# Altium footprint library Connector_Samtec_HLE_SMD.PcbLib: 290 footprints (part 17 of 24)
Each footprint in its own frame and in the unit in brackets; x right, y up, seen from the top. Pads: shape width x height; smd on the part's side, far side on the other; paste and mask are expansions set on the pad; w line width, h text height; cw(c..) or ccw(c..) is an arc to the next point about the centre after c.
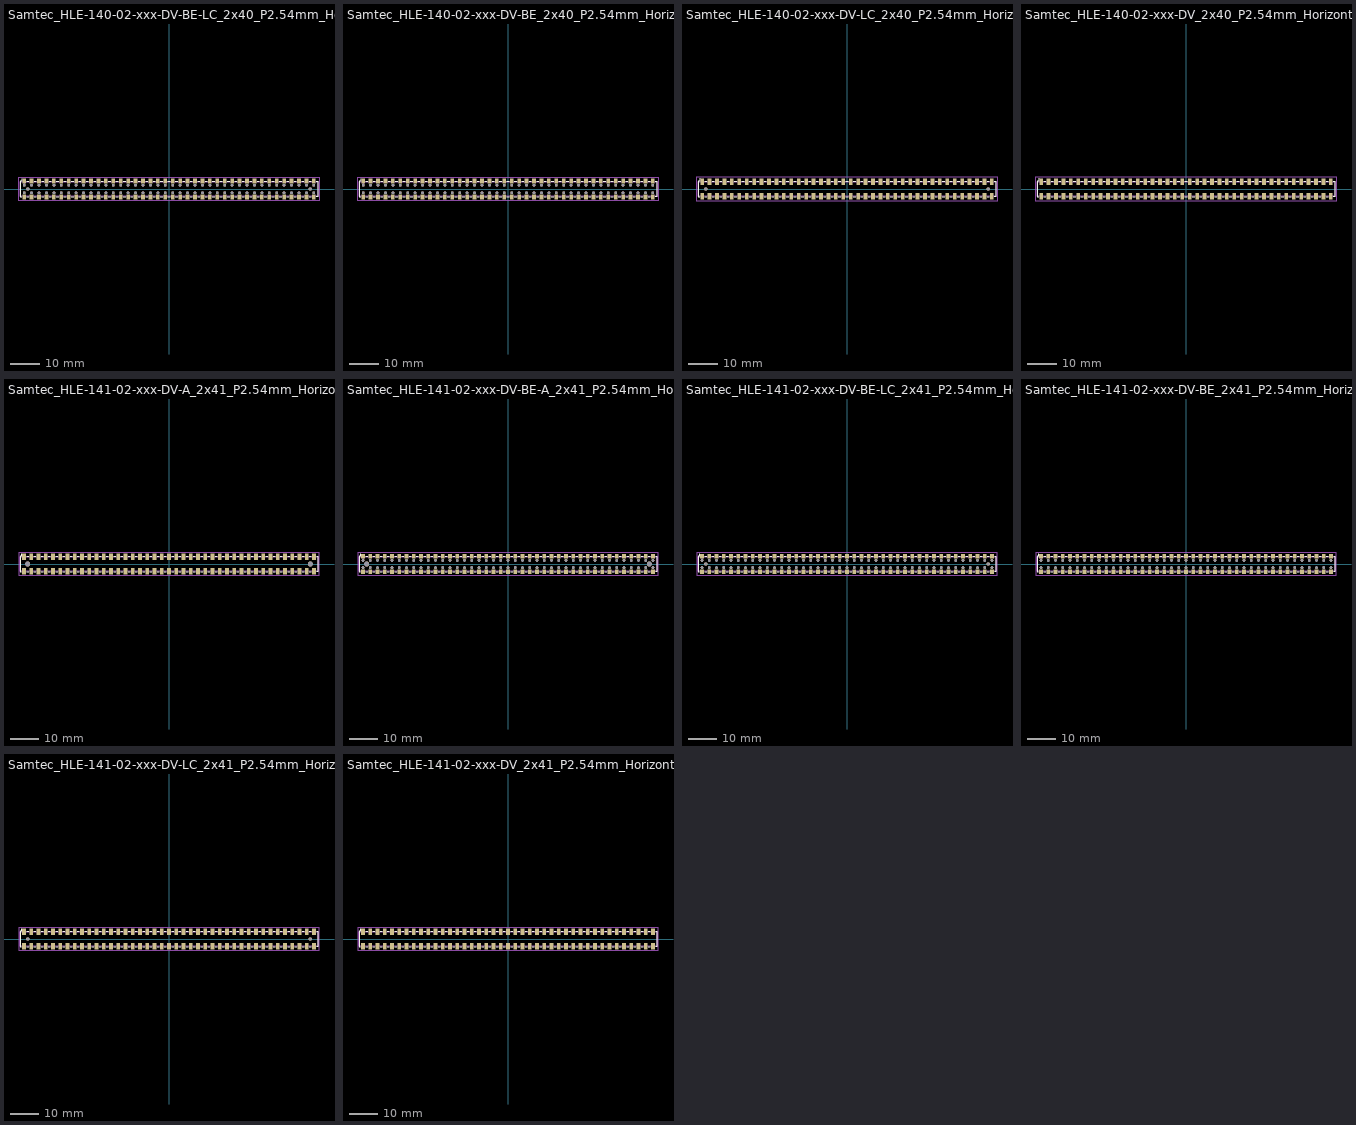
[diagram p16: the footprints below, top view; thin cyan lines are the x and y axes]

## Samtec_HLE-140-02-xxx-DV-BE-LC_2x40_P2.54mm_Horizontal [mm]
pads (162):
  rect 1.27x1.68 smd: 1(-49.53,2.72) 2(-49.53,-2.72) 3(-46.99,2.72) 4(-46.99,-2.72) 5(-44.45,2.72) 6(-44.45,-2.72) 7(-41.91,2.72) 8(-41.91,-2.72) 9(-39.37,2.72) 10(-39.37,-2.72) 11(-36.83,2.72) 12(-36.83,-2.72) 13(-34.29,2.72) 14(-34.29,-2.72) 15(-31.75,2.72) 16(-31.75,-2.72) 17(-29.21,2.72) 18(-29.21,-2.72) 19(-26.67,2.72) 20(-26.67,-2.72) 21(-24.13,2.72) 22(-24.13,-2.72) 23(-21.59,2.72) 24(-21.59,-2.72) 25(-19.05,2.72) 26(-19.05,-2.72) 27(-16.51,2.72) 28(-16.51,-2.72) 29(-13.97,2.72) 30(-13.97,-2.72) 31(-11.43,2.72) 32(-11.43,-2.72) 33(-8.89,2.72) 34(-8.89,-2.72) 35(-6.35,2.72) 36(-6.35,-2.72) 37(-3.81,2.72) 38(-3.81,-2.72) 39(-1.27,2.72) 40(-1.27,-2.72) 41(1.27,2.72) 42(1.27,-2.72) 43(3.81,2.72) 44(3.81,-2.72) 45(6.35,2.72) 46(6.35,-2.72) 47(8.89,2.72) 48(8.89,-2.72) 49(11.43,2.72) 50(11.43,-2.72) 51(13.97,2.72) 52(13.97,-2.72) 53(16.51,2.72) 54(16.51,-2.72) 55(19.05,2.72) 56(19.05,-2.72) 57(21.59,2.72) 58(21.59,-2.72) 59(24.13,2.72) 60(24.13,-2.72) 61(26.67,2.72) 62(26.67,-2.72) 63(29.21,2.72) 64(29.21,-2.72) 65(31.75,2.72) 66(31.75,-2.72) 67(34.29,2.72) 68(34.29,-2.72) 69(36.83,2.72) 70(36.83,-2.72) 71(39.37,2.72) 72(39.37,-2.72) 73(41.91,2.72) 74(41.91,-2.72) 75(44.45,2.72) 76(44.45,-2.72) 77(46.99,2.72) 78(46.99,-2.72) 79(49.53,2.72) 80(49.53,-2.72)
  round 0.97 hole 0.97: Un1(41.91,-1.27) Un2(49.53,1.27) Un3(41.91,1.27) Un4(3.81,-1.27) Un5(-21.59,1.27) Un6(39.37,-1.27) Un7(-36.83,1.27) Un8(36.83,1.27) Un9(-41.91,1.27) Un10(-6.35,1.27) Un11(-34.29,-1.27) Un12(46.99,1.27) Un13(49.53,-1.27) Un14(-8.89,1.27) Un15(36.83,-1.27) Un16(-11.43,1.27) Un17(-29.21,1.27) Un18(13.97,1.27) Un19(-44.45,1.27) Un20(6.35,1.27) Un21(21.59,-1.27) Un22(-6.35,-1.27) Un23(24.13,1.27) Un24(46.99,-1.27) Un25(-39.37,1.27) Un26(-41.91,-1.27) Un27(44.45,1.27) Un28(-11.43,-1.27) Un30(39.37,1.27) Un31(-3.81,1.27) Un32(3.81,1.27) Un33(16.51,1.27) Un34(-13.97,-1.27) Un35(-24.13,1.27) Un36(-16.51,1.27) Un37(-44.45,-1.27) Un38(-36.83,-1.27) Un39(-39.37,-1.27) Un40(-3.81,-1.27) Un41(-49.53,1.27) Un42(31.75,-1.27) Un43(-8.89,-1.27) Un44(-21.59,-1.27) Un45(26.67,1.27) Un46(29.21,-1.27) Un48(-46.99,1.27) Un49(-24.13,-1.27) Un50(34.29,-1.27) Un51(-26.67,-1.27) Un52(-46.99,-1.27) Un53(-1.27,1.27) Un54(6.35,-1.27) Un55(-49.53,-1.27) Un56(8.89,-1.27) Un57(26.67,-1.27) Un58(11.43,1.27) Un59(19.05,-1.27) Un60(24.13,-1.27) Un61(13.97,-1.27) Un62(31.75,1.27) Un63(-34.29,1.27) Un64(-16.51,-1.27) Un65(-13.97,1.27) Un66(11.43,-1.27) Un67(-31.75,-1.27) Un68(16.51,-1.27) Un69(21.59,1.27) Un70(-1.27,-1.27) Un71(34.29,1.27) Un72(1.27,1.27) Un73(-31.75,1.27) Un74(44.45,-1.27) Un75(1.27,-1.27) Un76(8.89,1.27) Un77(-29.21,-1.27) Un78(-19.05,-1.27) Un79(29.21,1.27) Un80(-26.67,1.27) Un81(-19.05,1.27) Un82(19.05,1.27)
  round 1.19 hole 1.19: Un29(48.26,0) Un47(-48.26,0)
F.SilkS:
  lines w0.12: -50.425,-2.65 -50.91,-2.65 -50.91,2.65 -50.425,2.65 -50.425,3.56 ; -48.635,-2.65 -47.885,-2.65 ; -48.635,2.65 -47.885,2.65 ; -46.095,-2.65 -45.345,-2.65 ; -46.095,2.65 -45.345,2.65 ; -43.555,-2.65 -42.805,-2.65 ; -43.555,2.65 -42.805,2.65 ; -41.015,-2.65 -40.265,-2.65 ; -41.015,2.65 -40.265,2.65 ; -38.475,-2.65 -37.725,-2.65 ; -38.475,2.65 -37.725,2.65 ; -35.935,-2.65 -35.185,-2.65 ; -35.935,2.65 -35.185,2.65 ; -33.395,-2.65 -32.645,-2.65 ; -33.395,2.65 -32.645,2.65 ; -30.855,-2.65 -30.105,-2.65 ; -30.855,2.65 -30.105,2.65 ; -28.315,-2.65 -27.565,-2.65 ; -28.315,2.65 -27.565,2.65 ; -25.775,-2.65 -25.025,-2.65 ; -25.775,2.65 -25.025,2.65 ; -23.235,-2.65 -22.485,-2.65 ; -23.235,2.65 -22.485,2.65 ; -20.695,-2.65 -19.945,-2.65 ; -20.695,2.65 -19.945,2.65 ; -18.155,-2.65 -17.405,-2.65 ; -18.155,2.65 -17.405,2.65 ; -15.615,-2.65 -14.865,-2.65 ; -15.615,2.65 -14.865,2.65 ; -13.075,-2.65 -12.325,-2.65 ; -13.075,2.65 -12.325,2.65 ; -10.535,-2.65 -9.785,-2.65 ; -10.535,2.65 -9.785,2.65 ; -7.995,-2.65 -7.245,-2.65 ; -7.995,2.65 -7.245,2.65 ; -5.455,-2.65 -4.705,-2.65 ; -5.455,2.65 -4.705,2.65 ; -2.915,-2.65 -2.165,-2.65 ; -2.915,2.65 -2.165,2.65 ; -0.375,-2.65 0.375,-2.65 ; -0.375,2.65 0.375,2.65 ; 2.165,-2.65 2.915,-2.65 ; 2.165,2.65 2.915,2.65 ; 4.705,-2.65 5.455,-2.65 ; 4.705,2.65 5.455,2.65 ; 7.245,-2.65 7.995,-2.65 ; 7.245,2.65 7.995,2.65 ; 9.785,-2.65 10.535,-2.65 ; 9.785,2.65 10.535,2.65 ; 12.325,-2.65 13.075,-2.65 ; 12.325,2.65 13.075,2.65 ; 14.865,-2.65 15.615,-2.65 ; 14.865,2.65 15.615,2.65 ; 17.405,-2.65 18.155,-2.65 ; 17.405,2.65 18.155,2.65 ; 19.945,-2.65 20.695,-2.65 ; 19.945,2.65 20.695,2.65 ; 22.485,-2.65 23.235,-2.65 ; 22.485,2.65 23.235,2.65 ; 25.025,-2.65 25.775,-2.65 ; 25.025,2.65 25.775,2.65 ; 27.565,-2.65 28.315,-2.65 ; 27.565,2.65 28.315,2.65 ; 30.105,-2.65 30.855,-2.65 ; 30.105,2.65 30.855,2.65 ; 32.645,-2.65 33.395,-2.65 ; 32.645,2.65 33.395,2.65 ; 35.185,-2.65 35.935,-2.65 ; 35.185,2.65 35.935,2.65 ; 37.725,-2.65 38.475,-2.65 ; 37.725,2.65 38.475,2.65 ; 40.265,-2.65 41.015,-2.65 ; 40.265,2.65 41.015,2.65 ; 42.805,-2.65 43.555,-2.65 ; 42.805,2.65 43.555,2.65 ; 45.345,-2.65 46.095,-2.65 ; 45.345,2.65 46.095,2.65 ; 47.885,-2.65 48.635,-2.65 ; 47.885,2.65 48.635,2.65 ; 50.425,-2.65 50.91,-2.65 50.91,2.65 50.425,2.65
F.CrtYd:
  lines w0.05: -51.3,-4.06 -51.3,4.06 51.3,4.06 51.3,-4.06 -51.3,-4.06
F.Fab:
  lines w0.1: -50.03,2.54 -49.53,1.833 -49.03,2.54 ; -50.8,-2.54 50.8,-2.54 50.8,2.54 -50.8,2.54 -50.8,-2.54
  text "'.Designator'" at -4.047,-2.68 h1

## Samtec_HLE-140-02-xxx-DV-BE_2x40_P2.54mm_Horizontal [mm]
pads (160):
  rect 1.27x1.68 smd: 1(-49.53,2.72) 2(-49.53,-2.72) 3(-46.99,2.72) 4(-46.99,-2.72) 5(-44.45,2.72) 6(-44.45,-2.72) 7(-41.91,2.72) 8(-41.91,-2.72) 9(-39.37,2.72) 10(-39.37,-2.72) 11(-36.83,2.72) 12(-36.83,-2.72) 13(-34.29,2.72) 14(-34.29,-2.72) 15(-31.75,2.72) 16(-31.75,-2.72) 17(-29.21,2.72) 18(-29.21,-2.72) 19(-26.67,2.72) 20(-26.67,-2.72) 21(-24.13,2.72) 22(-24.13,-2.72) 23(-21.59,2.72) 24(-21.59,-2.72) 25(-19.05,2.72) 26(-19.05,-2.72) 27(-16.51,2.72) 28(-16.51,-2.72) 29(-13.97,2.72) 30(-13.97,-2.72) 31(-11.43,2.72) 32(-11.43,-2.72) 33(-8.89,2.72) 34(-8.89,-2.72) 35(-6.35,2.72) 36(-6.35,-2.72) 37(-3.81,2.72) 38(-3.81,-2.72) 39(-1.27,2.72) 40(-1.27,-2.72) 41(1.27,2.72) 42(1.27,-2.72) 43(3.81,2.72) 44(3.81,-2.72) 45(6.35,2.72) 46(6.35,-2.72) 47(8.89,2.72) 48(8.89,-2.72) 49(11.43,2.72) 50(11.43,-2.72) 51(13.97,2.72) 52(13.97,-2.72) 53(16.51,2.72) 54(16.51,-2.72) 55(19.05,2.72) 56(19.05,-2.72) 57(21.59,2.72) 58(21.59,-2.72) 59(24.13,2.72) 60(24.13,-2.72) 61(26.67,2.72) 62(26.67,-2.72) 63(29.21,2.72) 64(29.21,-2.72) 65(31.75,2.72) 66(31.75,-2.72) 67(34.29,2.72) 68(34.29,-2.72) 69(36.83,2.72) 70(36.83,-2.72) 71(39.37,2.72) 72(39.37,-2.72) 73(41.91,2.72) 74(41.91,-2.72) 75(44.45,2.72) 76(44.45,-2.72) 77(46.99,2.72) 78(46.99,-2.72) 79(49.53,2.72) 80(49.53,-2.72)
  round 0.97 hole 0.97: Un1(-26.67,1.27) Un2(-34.29,1.27) Un3(13.97,1.27) Un4(-16.51,1.27) Un5(-6.35,1.27) Un6(-11.43,1.27) Un7(1.27,1.27) Un8(-46.99,1.27) Un9(21.59,-1.27) Un10(39.37,-1.27) Un11(-13.97,1.27) Un12(-29.21,-1.27) Un13(34.29,-1.27) Un14(19.05,1.27) Un15(-11.43,-1.27) Un16(36.83,1.27) Un17(-44.45,1.27) Un18(46.99,-1.27) Un19(21.59,1.27) Un20(26.67,1.27) Un21(19.05,-1.27) Un22(-19.05,1.27) Un23(-36.83,-1.27) Un24(16.51,1.27) Un25(-3.81,1.27) Un26(-49.53,1.27) Un27(-1.27,1.27) Un28(16.51,-1.27) Un29(-31.75,1.27) Un30(49.53,-1.27) Un31(6.35,1.27) Un32(31.75,1.27) Un33(49.53,1.27) Un34(41.91,-1.27) Un35(-3.81,-1.27) Un36(34.29,1.27) Un37(-41.91,-1.27) Un38(13.97,-1.27) Un39(-13.97,-1.27) Un40(41.91,1.27) Un41(11.43,-1.27) Un42(6.35,-1.27) Un43(1.27,-1.27) Un44(44.45,1.27) Un45(-19.05,-1.27) Un46(3.81,1.27) Un47(-8.89,1.27) Un48(-1.27,-1.27) Un49(11.43,1.27) Un50(-44.45,-1.27) Un51(-39.37,1.27) Un52(-41.91,1.27) Un53(31.75,-1.27) Un54(3.81,-1.27) Un55(-24.13,-1.27) Un56(-49.53,-1.27) Un57(24.13,-1.27) Un58(39.37,1.27) Un59(-16.51,-1.27) Un60(24.13,1.27) Un61(29.21,-1.27) Un62(-36.83,1.27) Un63(-31.75,-1.27) Un64(-26.67,-1.27) Un65(-6.35,-1.27) Un66(44.45,-1.27) Un67(36.83,-1.27) Un68(-21.59,1.27) Un69(-29.21,1.27) Un70(46.99,1.27) Un71(-46.99,-1.27) Un72(-21.59,-1.27) Un73(8.89,1.27) Un74(-34.29,-1.27) Un75(29.21,1.27) Un76(-24.13,1.27) Un77(26.67,-1.27) Un78(-39.37,-1.27) Un79(8.89,-1.27) Un80(-8.89,-1.27)
F.SilkS:
  lines w0.12: -50.425,-2.65 -50.91,-2.65 -50.91,2.65 -50.425,2.65 -50.425,3.56 ; -48.635,-2.65 -47.885,-2.65 ; -48.635,2.65 -47.885,2.65 ; -46.095,-2.65 -45.345,-2.65 ; -46.095,2.65 -45.345,2.65 ; -43.555,-2.65 -42.805,-2.65 ; -43.555,2.65 -42.805,2.65 ; -41.015,-2.65 -40.265,-2.65 ; -41.015,2.65 -40.265,2.65 ; -38.475,-2.65 -37.725,-2.65 ; -38.475,2.65 -37.725,2.65 ; -35.935,-2.65 -35.185,-2.65 ; -35.935,2.65 -35.185,2.65 ; -33.395,-2.65 -32.645,-2.65 ; -33.395,2.65 -32.645,2.65 ; -30.855,-2.65 -30.105,-2.65 ; -30.855,2.65 -30.105,2.65 ; -28.315,-2.65 -27.565,-2.65 ; -28.315,2.65 -27.565,2.65 ; -25.775,-2.65 -25.025,-2.65 ; -25.775,2.65 -25.025,2.65 ; -23.235,-2.65 -22.485,-2.65 ; -23.235,2.65 -22.485,2.65 ; -20.695,-2.65 -19.945,-2.65 ; -20.695,2.65 -19.945,2.65 ; -18.155,-2.65 -17.405,-2.65 ; -18.155,2.65 -17.405,2.65 ; -15.615,-2.65 -14.865,-2.65 ; -15.615,2.65 -14.865,2.65 ; -13.075,-2.65 -12.325,-2.65 ; -13.075,2.65 -12.325,2.65 ; -10.535,-2.65 -9.785,-2.65 ; -10.535,2.65 -9.785,2.65 ; -7.995,-2.65 -7.245,-2.65 ; -7.995,2.65 -7.245,2.65 ; -5.455,-2.65 -4.705,-2.65 ; -5.455,2.65 -4.705,2.65 ; -2.915,-2.65 -2.165,-2.65 ; -2.915,2.65 -2.165,2.65 ; -0.375,-2.65 0.375,-2.65 ; -0.375,2.65 0.375,2.65 ; 2.165,-2.65 2.915,-2.65 ; 2.165,2.65 2.915,2.65 ; 4.705,-2.65 5.455,-2.65 ; 4.705,2.65 5.455,2.65 ; 7.245,-2.65 7.995,-2.65 ; 7.245,2.65 7.995,2.65 ; 9.785,-2.65 10.535,-2.65 ; 9.785,2.65 10.535,2.65 ; 12.325,-2.65 13.075,-2.65 ; 12.325,2.65 13.075,2.65 ; 14.865,-2.65 15.615,-2.65 ; 14.865,2.65 15.615,2.65 ; 17.405,-2.65 18.155,-2.65 ; 17.405,2.65 18.155,2.65 ; 19.945,-2.65 20.695,-2.65 ; 19.945,2.65 20.695,2.65 ; 22.485,-2.65 23.235,-2.65 ; 22.485,2.65 23.235,2.65 ; 25.025,-2.65 25.775,-2.65 ; 25.025,2.65 25.775,2.65 ; 27.565,-2.65 28.315,-2.65 ; 27.565,2.65 28.315,2.65 ; 30.105,-2.65 30.855,-2.65 ; 30.105,2.65 30.855,2.65 ; 32.645,-2.65 33.395,-2.65 ; 32.645,2.65 33.395,2.65 ; 35.185,-2.65 35.935,-2.65 ; 35.185,2.65 35.935,2.65 ; 37.725,-2.65 38.475,-2.65 ; 37.725,2.65 38.475,2.65 ; 40.265,-2.65 41.015,-2.65 ; 40.265,2.65 41.015,2.65 ; 42.805,-2.65 43.555,-2.65 ; 42.805,2.65 43.555,2.65 ; 45.345,-2.65 46.095,-2.65 ; 45.345,2.65 46.095,2.65 ; 47.885,-2.65 48.635,-2.65 ; 47.885,2.65 48.635,2.65 ; 50.425,-2.65 50.91,-2.65 50.91,2.65 50.425,2.65
F.CrtYd:
  lines w0.05: -51.3,-4.06 51.3,-4.06 51.3,4.06 -51.3,4.06 -51.3,-4.06
F.Fab:
  lines w0.1: -50.03,2.54 -49.53,1.833 -49.03,2.54 ; -50.8,-2.54 -50.8,2.54 50.8,2.54 50.8,-2.54 -50.8,-2.54
  text "'.Designator'" at -4.047,-2.68 h1

## Samtec_HLE-140-02-xxx-DV-LC_2x40_P2.54mm_Horizontal [mm]
pads (82):
  rect 1.27x2.29 smd: 1(-49.53,2.525) 2(-49.53,-2.525) 3(-46.99,2.525) 4(-46.99,-2.525) 5(-44.45,2.525) 6(-44.45,-2.525) 7(-41.91,2.525) 8(-41.91,-2.525) 9(-39.37,2.525) 10(-39.37,-2.525) 11(-36.83,2.525) 12(-36.83,-2.525) 13(-34.29,2.525) 14(-34.29,-2.525) 15(-31.75,2.525) 16(-31.75,-2.525) 17(-29.21,2.525) 18(-29.21,-2.525) 19(-26.67,2.525) 20(-26.67,-2.525) 21(-24.13,2.525) 22(-24.13,-2.525) 23(-21.59,2.525) 24(-21.59,-2.525) 25(-19.05,2.525) 26(-19.05,-2.525) 27(-16.51,2.525) 28(-16.51,-2.525) 29(-13.97,2.525) 30(-13.97,-2.525) 31(-11.43,2.525) 32(-11.43,-2.525) 33(-8.89,2.525) 34(-8.89,-2.525) 35(-6.35,2.525) 36(-6.35,-2.525) 37(-3.81,2.525) 38(-3.81,-2.525) 39(-1.27,2.525) 40(-1.27,-2.525) 41(1.27,2.525) 42(1.27,-2.525) 43(3.81,2.525) 44(3.81,-2.525) 45(6.35,2.525) 46(6.35,-2.525) 47(8.89,2.525) 48(8.89,-2.525) 49(11.43,2.525) 50(11.43,-2.525) 51(13.97,2.525) 52(13.97,-2.525) 53(16.51,2.525) 54(16.51,-2.525) 55(19.05,2.525) 56(19.05,-2.525) 57(21.59,2.525) 58(21.59,-2.525) 59(24.13,2.525) 60(24.13,-2.525) 61(26.67,2.525) 62(26.67,-2.525) 63(29.21,2.525) 64(29.21,-2.525) 65(31.75,2.525) 66(31.75,-2.525) 67(34.29,2.525) 68(34.29,-2.525) 69(36.83,2.525) 70(36.83,-2.525) 71(39.37,2.525) 72(39.37,-2.525) 73(41.91,2.525) 74(41.91,-2.525) 75(44.45,2.525) 76(44.45,-2.525) 77(46.99,2.525) 78(46.99,-2.525) 79(49.53,2.525) 80(49.53,-2.525)
  round 1.19 hole 1.19: Un1(-48.26,0) Un2(48.26,0)
F.SilkS:
  lines w0.12: -50.425,-2.65 -50.91,-2.65 -50.91,2.65 -50.425,2.65 -50.425,3.67 ; -48.635,-2.65 -47.885,-2.65 ; -48.635,2.65 -47.885,2.65 ; -46.095,-2.65 -45.345,-2.65 ; -46.095,2.65 -45.345,2.65 ; -43.555,-2.65 -42.805,-2.65 ; -43.555,2.65 -42.805,2.65 ; -41.015,-2.65 -40.265,-2.65 ; -41.015,2.65 -40.265,2.65 ; -38.475,-2.65 -37.725,-2.65 ; -38.475,2.65 -37.725,2.65 ; -35.935,-2.65 -35.185,-2.65 ; -35.935,2.65 -35.185,2.65 ; -33.395,-2.65 -32.645,-2.65 ; -33.395,2.65 -32.645,2.65 ; -30.855,-2.65 -30.105,-2.65 ; -30.855,2.65 -30.105,2.65 ; -28.315,-2.65 -27.565,-2.65 ; -28.315,2.65 -27.565,2.65 ; -25.775,-2.65 -25.025,-2.65 ; -25.775,2.65 -25.025,2.65 ; -23.235,-2.65 -22.485,-2.65 ; -23.235,2.65 -22.485,2.65 ; -20.695,-2.65 -19.945,-2.65 ; -20.695,2.65 -19.945,2.65 ; -18.155,-2.65 -17.405,-2.65 ; -18.155,2.65 -17.405,2.65 ; -15.615,-2.65 -14.865,-2.65 ; -15.615,2.65 -14.865,2.65 ; -13.075,-2.65 -12.325,-2.65 ; -13.075,2.65 -12.325,2.65 ; -10.535,-2.65 -9.785,-2.65 ; -10.535,2.65 -9.785,2.65 ; -7.995,-2.65 -7.245,-2.65 ; -7.995,2.65 -7.245,2.65 ; -5.455,-2.65 -4.705,-2.65 ; -5.455,2.65 -4.705,2.65 ; -2.915,-2.65 -2.165,-2.65 ; -2.915,2.65 -2.165,2.65 ; -0.375,-2.65 0.375,-2.65 ; -0.375,2.65 0.375,2.65 ; 2.165,-2.65 2.915,-2.65 ; 2.165,2.65 2.915,2.65 ; 4.705,-2.65 5.455,-2.65 ; 4.705,2.65 5.455,2.65 ; 7.245,-2.65 7.995,-2.65 ; 7.245,2.65 7.995,2.65 ; 9.785,-2.65 10.535,-2.65 ; 9.785,2.65 10.535,2.65 ; 12.325,-2.65 13.075,-2.65 ; 12.325,2.65 13.075,2.65 ; 14.865,-2.65 15.615,-2.65 ; 14.865,2.65 15.615,2.65 ; 17.405,-2.65 18.155,-2.65 ; 17.405,2.65 18.155,2.65 ; 19.945,-2.65 20.695,-2.65 ; 19.945,2.65 20.695,2.65 ; 22.485,-2.65 23.235,-2.65 ; 22.485,2.65 23.235,2.65 ; 25.025,-2.65 25.775,-2.65 ; 25.025,2.65 25.775,2.65 ; 27.565,-2.65 28.315,-2.65 ; 27.565,2.65 28.315,2.65 ; 30.105,-2.65 30.855,-2.65 ; 30.105,2.65 30.855,2.65 ; 32.645,-2.65 33.395,-2.65 ; 32.645,2.65 33.395,2.65 ; 35.185,-2.65 35.935,-2.65 ; 35.185,2.65 35.935,2.65 ; 37.725,-2.65 38.475,-2.65 ; 37.725,2.65 38.475,2.65 ; 40.265,-2.65 41.015,-2.65 ; 40.265,2.65 41.015,2.65 ; 42.805,-2.65 43.555,-2.65 ; 42.805,2.65 43.555,2.65 ; 45.345,-2.65 46.095,-2.65 ; 45.345,2.65 46.095,2.65 ; 47.885,-2.65 48.635,-2.65 ; 47.885,2.65 48.635,2.65 ; 50.425,-2.65 50.91,-2.65 50.91,2.65 50.425,2.65
F.CrtYd:
  lines w0.05: -51.3,-4.17 -51.3,4.17 51.3,4.17 51.3,-4.17 -51.3,-4.17
F.Fab:
  lines w0.1: -50.03,2.54 -49.53,1.833 -49.03,2.54 ; -50.8,-2.54 50.8,-2.54 50.8,2.54 -50.8,2.54 -50.8,-2.54
  text "'.Designator'" at -4.047,-2.68 h1

## Samtec_HLE-140-02-xxx-DV_2x40_P2.54mm_Horizontal [mm]
pads (80):
  rect 1.27x2.29 smd: 1(-49.53,2.525) 2(-49.53,-2.525) 3(-46.99,2.525) 4(-46.99,-2.525) 5(-44.45,2.525) 6(-44.45,-2.525) 7(-41.91,2.525) 8(-41.91,-2.525) 9(-39.37,2.525) 10(-39.37,-2.525) 11(-36.83,2.525) 12(-36.83,-2.525) 13(-34.29,2.525) 14(-34.29,-2.525) 15(-31.75,2.525) 16(-31.75,-2.525) 17(-29.21,2.525) 18(-29.21,-2.525) 19(-26.67,2.525) 20(-26.67,-2.525) 21(-24.13,2.525) 22(-24.13,-2.525) 23(-21.59,2.525) 24(-21.59,-2.525) 25(-19.05,2.525) 26(-19.05,-2.525) 27(-16.51,2.525) 28(-16.51,-2.525) 29(-13.97,2.525) 30(-13.97,-2.525) 31(-11.43,2.525) 32(-11.43,-2.525) 33(-8.89,2.525) 34(-8.89,-2.525) 35(-6.35,2.525) 36(-6.35,-2.525) 37(-3.81,2.525) 38(-3.81,-2.525) 39(-1.27,2.525) 40(-1.27,-2.525) 41(1.27,2.525) 42(1.27,-2.525) 43(3.81,2.525) 44(3.81,-2.525) 45(6.35,2.525) 46(6.35,-2.525) 47(8.89,2.525) 48(8.89,-2.525) 49(11.43,2.525) 50(11.43,-2.525) 51(13.97,2.525) 52(13.97,-2.525) 53(16.51,2.525) 54(16.51,-2.525) 55(19.05,2.525) 56(19.05,-2.525) 57(21.59,2.525) 58(21.59,-2.525) 59(24.13,2.525) 60(24.13,-2.525) 61(26.67,2.525) 62(26.67,-2.525) 63(29.21,2.525) 64(29.21,-2.525) 65(31.75,2.525) 66(31.75,-2.525) 67(34.29,2.525) 68(34.29,-2.525) 69(36.83,2.525) 70(36.83,-2.525) 71(39.37,2.525) 72(39.37,-2.525) 73(41.91,2.525) 74(41.91,-2.525) 75(44.45,2.525) 76(44.45,-2.525) 77(46.99,2.525) 78(46.99,-2.525) 79(49.53,2.525) 80(49.53,-2.525)
F.SilkS:
  lines w0.12: -50.425,-2.65 -50.91,-2.65 -50.91,2.65 -50.425,2.65 -50.425,3.67 ; -48.635,-2.65 -47.885,-2.65 ; -48.635,2.65 -47.885,2.65 ; -46.095,-2.65 -45.345,-2.65 ; -46.095,2.65 -45.345,2.65 ; -43.555,-2.65 -42.805,-2.65 ; -43.555,2.65 -42.805,2.65 ; -41.015,-2.65 -40.265,-2.65 ; -41.015,2.65 -40.265,2.65 ; -38.475,-2.65 -37.725,-2.65 ; -38.475,2.65 -37.725,2.65 ; -35.935,-2.65 -35.185,-2.65 ; -35.935,2.65 -35.185,2.65 ; -33.395,-2.65 -32.645,-2.65 ; -33.395,2.65 -32.645,2.65 ; -30.855,-2.65 -30.105,-2.65 ; -30.855,2.65 -30.105,2.65 ; -28.315,-2.65 -27.565,-2.65 ; -28.315,2.65 -27.565,2.65 ; -25.775,-2.65 -25.025,-2.65 ; -25.775,2.65 -25.025,2.65 ; -23.235,-2.65 -22.485,-2.65 ; -23.235,2.65 -22.485,2.65 ; -20.695,-2.65 -19.945,-2.65 ; -20.695,2.65 -19.945,2.65 ; -18.155,-2.65 -17.405,-2.65 ; -18.155,2.65 -17.405,2.65 ; -15.615,-2.65 -14.865,-2.65 ; -15.615,2.65 -14.865,2.65 ; -13.075,-2.65 -12.325,-2.65 ; -13.075,2.65 -12.325,2.65 ; -10.535,-2.65 -9.785,-2.65 ; -10.535,2.65 -9.785,2.65 ; -7.995,-2.65 -7.245,-2.65 ; -7.995,2.65 -7.245,2.65 ; -5.455,-2.65 -4.705,-2.65 ; -5.455,2.65 -4.705,2.65 ; -2.915,-2.65 -2.165,-2.65 ; -2.915,2.65 -2.165,2.65 ; -0.375,-2.65 0.375,-2.65 ; -0.375,2.65 0.375,2.65 ; 2.165,-2.65 2.915,-2.65 ; 2.165,2.65 2.915,2.65 ; 4.705,-2.65 5.455,-2.65 ; 4.705,2.65 5.455,2.65 ; 7.245,-2.65 7.995,-2.65 ; 7.245,2.65 7.995,2.65 ; 9.785,-2.65 10.535,-2.65 ; 9.785,2.65 10.535,2.65 ; 12.325,-2.65 13.075,-2.65 ; 12.325,2.65 13.075,2.65 ; 14.865,-2.65 15.615,-2.65 ; 14.865,2.65 15.615,2.65 ; 17.405,-2.65 18.155,-2.65 ; 17.405,2.65 18.155,2.65 ; 19.945,-2.65 20.695,-2.65 ; 19.945,2.65 20.695,2.65 ; 22.485,-2.65 23.235,-2.65 ; 22.485,2.65 23.235,2.65 ; 25.025,-2.65 25.775,-2.65 ; 25.025,2.65 25.775,2.65 ; 27.565,-2.65 28.315,-2.65 ; 27.565,2.65 28.315,2.65 ; 30.105,-2.65 30.855,-2.65 ; 30.105,2.65 30.855,2.65 ; 32.645,-2.65 33.395,-2.65 ; 32.645,2.65 33.395,2.65 ; 35.185,-2.65 35.935,-2.65 ; 35.185,2.65 35.935,2.65 ; 37.725,-2.65 38.475,-2.65 ; 37.725,2.65 38.475,2.65 ; 40.265,-2.65 41.015,-2.65 ; 40.265,2.65 41.015,2.65 ; 42.805,-2.65 43.555,-2.65 ; 42.805,2.65 43.555,2.65 ; 45.345,-2.65 46.095,-2.65 ; 45.345,2.65 46.095,2.65 ; 47.885,-2.65 48.635,-2.65 ; 47.885,2.65 48.635,2.65 ; 50.425,-2.65 50.91,-2.65 50.91,2.65 50.425,2.65
F.CrtYd:
  lines w0.05: -51.3,-4.17 -51.3,4.17 51.3,4.17 51.3,-4.17 -51.3,-4.17
F.Fab:
  lines w0.1: -50.03,2.54 -49.53,1.833 -49.03,2.54 ; -50.8,-2.54 -50.8,2.54 50.8,2.54 50.8,-2.54 -50.8,-2.54
  text "'.Designator'" at -4.047,-2.68 h1

## Samtec_HLE-141-02-xxx-DV-A_2x41_P2.54mm_Horizontal [mm]
pads (84):
  rect 1.27x2.29 smd: 1(-50.8,2.525) 2(-50.8,-2.525) 3(-48.26,2.525) 4(-48.26,-2.525) 5(-45.72,2.525) 6(-45.72,-2.525) 7(-43.18,2.525) 8(-43.18,-2.525) 9(-40.64,2.525) 10(-40.64,-2.525) 11(-38.1,2.525) 12(-38.1,-2.525) 13(-35.56,2.525) 14(-35.56,-2.525) 15(-33.02,2.525) 16(-33.02,-2.525) 17(-30.48,2.525) 18(-30.48,-2.525) 19(-27.94,2.525) 20(-27.94,-2.525) 21(-25.4,2.525) 22(-25.4,-2.525) 23(-22.86,2.525) 24(-22.86,-2.525) 25(-20.32,2.525) 26(-20.32,-2.525) 27(-17.78,2.525) 28(-17.78,-2.525) 29(-15.24,2.525) 30(-15.24,-2.525) 31(-12.7,2.525) 32(-12.7,-2.525) 33(-10.16,2.525) 34(-10.16,-2.525) 35(-7.62,2.525) 36(-7.62,-2.525) 37(-5.08,2.525) 38(-5.08,-2.525) 39(-2.54,2.525) 40(-2.54,-2.525) 41(0,2.525) 42(0,-2.525) 43(2.54,2.525) 44(2.54,-2.525) 45(5.08,2.525) 46(5.08,-2.525) 47(7.62,2.525) 48(7.62,-2.525) 49(10.16,2.525) 50(10.16,-2.525) 51(12.7,2.525) 52(12.7,-2.525) 53(15.24,2.525) 54(15.24,-2.525) 55(17.78,2.525) 56(17.78,-2.525) 57(20.32,2.525) 58(20.32,-2.525) 59(22.86,2.525) 60(22.86,-2.525) 61(25.4,2.525) 62(25.4,-2.525) 63(27.94,2.525) 64(27.94,-2.525) 65(30.48,2.525) 66(30.48,-2.525) 67(33.02,2.525) 68(33.02,-2.525) 69(35.56,2.525) 70(35.56,-2.525) 71(38.1,2.525) 72(38.1,-2.525) 73(40.64,2.525) 74(40.64,-2.525) 75(43.18,2.525) 76(43.18,-2.525) 77(45.72,2.525) 78(45.72,-2.525) 79(48.26,2.525) 80(48.26,-2.525) 81(50.8,2.525) 82(50.8,-2.525)
  round 1.78 hole 1.78: Un1(49.53,0) Un2(-49.53,0)
F.SilkS:
  lines w0.12: -51.695,-2.65 -52.18,-2.65 -52.18,2.65 -51.695,2.65 -51.695,3.67 ; -49.905,-2.65 -49.155,-2.65 ; -49.905,2.65 -49.155,2.65 ; -47.365,-2.65 -46.615,-2.65 ; -47.365,2.65 -46.615,2.65 ; -44.825,-2.65 -44.075,-2.65 ; -44.825,2.65 -44.075,2.65 ; -42.285,-2.65 -41.535,-2.65 ; -42.285,2.65 -41.535,2.65 ; -39.745,-2.65 -38.995,-2.65 ; -39.745,2.65 -38.995,2.65 ; -37.205,-2.65 -36.455,-2.65 ; -37.205,2.65 -36.455,2.65 ; -34.665,-2.65 -33.915,-2.65 ; -34.665,2.65 -33.915,2.65 ; -32.125,-2.65 -31.375,-2.65 ; -32.125,2.65 -31.375,2.65 ; -29.585,-2.65 -28.835,-2.65 ; -29.585,2.65 -28.835,2.65 ; -27.045,-2.65 -26.295,-2.65 ; -27.045,2.65 -26.295,2.65 ; -24.505,-2.65 -23.755,-2.65 ; -24.505,2.65 -23.755,2.65 ; -21.965,-2.65 -21.215,-2.65 ; -21.965,2.65 -21.215,2.65 ; -19.425,-2.65 -18.675,-2.65 ; -19.425,2.65 -18.675,2.65 ; -16.885,-2.65 -16.135,-2.65 ; -16.885,2.65 -16.135,2.65 ; -14.345,-2.65 -13.595,-2.65 ; -14.345,2.65 -13.595,2.65 ; -11.805,-2.65 -11.055,-2.65 ; -11.805,2.65 -11.055,2.65 ; -9.265,-2.65 -8.515,-2.65 ; -9.265,2.65 -8.515,2.65 ; -6.725,-2.65 -5.975,-2.65 ; -6.725,2.65 -5.975,2.65 ; -4.185,-2.65 -3.435,-2.65 ; -4.185,2.65 -3.435,2.65 ; -1.645,-2.65 -0.895,-2.65 ; -1.645,2.65 -0.895,2.65 ; 0.895,-2.65 1.645,-2.65 ; 0.895,2.65 1.645,2.65 ; 3.435,-2.65 4.185,-2.65 ; 3.435,2.65 4.185,2.65 ; 5.975,-2.65 6.725,-2.65 ; 5.975,2.65 6.725,2.65 ; 8.515,-2.65 9.265,-2.65 ; 8.515,2.65 9.265,2.65 ; 11.055,-2.65 11.805,-2.65 ; 11.055,2.65 11.805,2.65 ; 13.595,-2.65 14.345,-2.65 ; 13.595,2.65 14.345,2.65 ; 16.135,-2.65 16.885,-2.65 ; 16.135,2.65 16.885,2.65 ; 18.675,-2.65 19.425,-2.65 ; 18.675,2.65 19.425,2.65 ; 21.215,-2.65 21.965,-2.65 ; 21.215,2.65 21.965,2.65 ; 23.755,-2.65 24.505,-2.65 ; 23.755,2.65 24.505,2.65 ; 26.295,-2.65 27.045,-2.65 ; 26.295,2.65 27.045,2.65 ; 28.835,-2.65 29.585,-2.65 ; 28.835,2.65 29.585,2.65 ; 31.375,-2.65 32.125,-2.65 ; 31.375,2.65 32.125,2.65 ; 33.915,-2.65 34.665,-2.65 ; 33.915,2.65 34.665,2.65 ; 36.455,-2.65 37.205,-2.65 ; 36.455,2.65 37.205,2.65 ; 38.995,-2.65 39.745,-2.65 ; 38.995,2.65 39.745,2.65 ; 41.535,-2.65 42.285,-2.65 ; 41.535,2.65 42.285,2.65 ; 44.075,-2.65 44.825,-2.65 ; 44.075,2.65 44.825,2.65 ; 46.615,-2.65 47.365,-2.65 ; 46.615,2.65 47.365,2.65 ; 49.155,-2.65 49.905,-2.65 ; 49.155,2.65 49.905,2.65 ; 51.695,-2.65 52.18,-2.65 52.18,2.65 51.695,2.65